# Altium footprint library MyPcbLib.PcbLib: 657 footprints (part 27 of 42)
Each footprint in its own frame and in the unit in brackets; x right, y up, seen from the top. Pads: shape width x height; smd on the part's side, far side on the other; paste and mask are expansions set on the pad; w line width, h text height; cw(c..) or ccw(c..) is an arc to the next point about the centre after c.
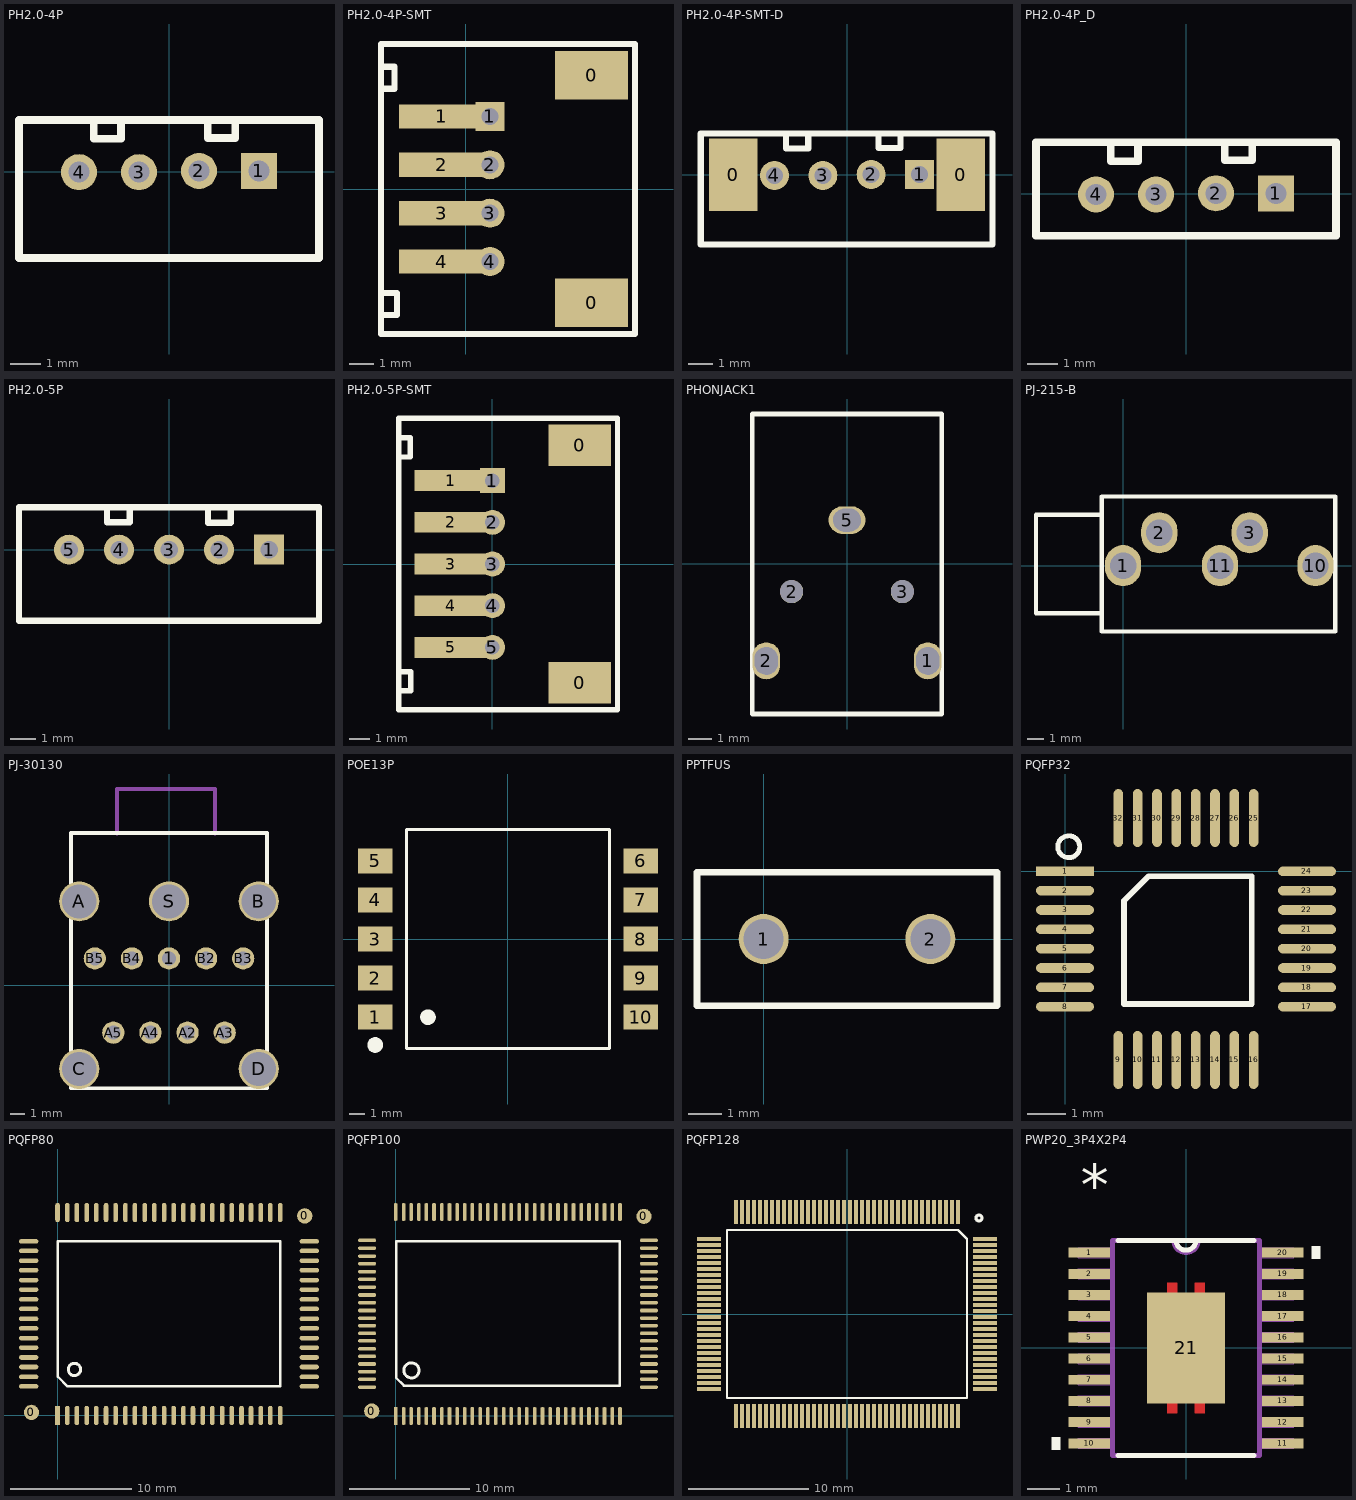
[diagram p26: the footprints below, top view; thin cyan lines are the x and y axes]

## PH2.0-4P [mm]
pads (4):
  rect 1.2x1.2 hole 0.7: 1(2.999,0.019)
  round 1.2 hole 0.7: 2(0.999,0.019) 3(-0.999,-0.019) 4(-2.999,-0.019)
Top Overlay:
  lines w0.254: -2.515,1.651 -2.515,1.092 -1.6,1.092 -1.6,1.6 ; 1.295,1.676 1.295,1.118 2.21,1.118 2.21,1.626 ; -5,-2.881 -5,1.719 4.999,1.719 4.999,-2.881 -5,-2.881

## PH2.0-4P-SMT [mm]
pads (10):
  rect 3x2 smd: 0(5.2,-4.7) 0(5.2,4.7)
  rect 3.5x1 smd: 1(-1,3) 2(-1,1) 3(-1,-1) 4(-1,-3)
  rect 1.2x1.2 hole 0.7: 1(1,3)
  round 1.2 hole 0.7: 2(1,1) 3(1,-1) 4(1,-3)
Top Overlay:
  lines w0.254: -3.505,4.141 -2.946,4.141 -2.946,5.055 -3.454,5.055 ; -3.403,-5.206 -2.845,-5.206 -2.845,-4.292 -3.353,-4.292 ; -3.5,-6 7,-6 7,6 -3.5,6 -3.5,-6

## PH2.0-4P-SMT-D [mm] "立贴"
pads (6):
  rect 2x3 smd: 0(-4.7,0) 0(4.7,0)
  rect 1.2x1.2 hole 0.7: 1(2.999,0.019)
  round 1.2 hole 0.7: 2(0.999,0.019) 3(-0.999,-0.019) 4(-2.999,-0.019)
Top Overlay:
  lines w0.254: -2.515,1.651 -2.515,1.092 -1.6,1.092 -1.6,1.6 ; 1.295,1.676 1.295,1.118 2.21,1.118 2.21,1.626 ; -6.045,-2.881 6.02,-2.881 6.02,1.719 -6.045,1.719 -6.045,-2.881

## PH2.0-4P_D [mm]
pads (4):
  rect 1.2x1.2 hole 0.7: 1(2.999,0.019)
  round 1.2 hole 0.7: 2(0.999,0.019) 3(-0.999,-0.019) 4(-2.999,-0.019)
Top Overlay:
  lines w0.254: -2.515,1.651 -2.515,1.092 -1.6,1.092 -1.6,1.6 ; 1.295,1.676 1.295,1.118 2.21,1.118 2.21,1.626 ; -5,-1.397 4.999,-1.397 4.999,1.719 -5,1.719 -5,-1.397

## PH2.0-5P [mm]
pads (5):
  rect 1.2x1.2 hole 0.7: 1(4,0)
  round 1.2 hole 0.7: 2(2,0) 3(0,0) 4(-2,0) 5(-4,0)
Top Overlay:
  lines w0.254: -2.479,1.657 -2.479,1.099 -1.565,1.099 -1.565,1.607 ; 1.56,1.632 1.56,1.073 2.474,1.073 2.474,1.581 ; -6,-2.845 -6,1.7 6,1.7 6,-2.845 -6,-2.845

## PH2.0-5P-SMT [mm]
pads (12):
  rect 3x2 smd: 0(4.2,-5.7) 0(4.2,5.7)
  rect 3.5x1 smd: 1(-2,4) 2(-2,2) 3(-2,0) 4(-2,-2) 5(-2,-4)
  rect 1.2x1.2 hole 0.7: 1(0,4)
  round 1.2 hole 0.7: 2(0,2) 3(0,0) 4(0,-2) 5(0,-4)
Top Overlay:
  lines w0.254: -4.505,5.141 -3.946,5.141 -3.946,6.055 -4.454,6.055 ; -4.48,-6.086 -3.921,-6.086 -3.921,-5.171 -4.429,-5.171 ; -4.5,-7 -4.5,7 6,7 6,-7 -4.5,-7

## PHONJACK1 [mm]
pads (5):
  oval 1.2x1.6 hole 1 slot 1.2 at 92 deg: 1(3.5,-4.2) 2(-3.5,-4.2)
  round 1 hole 1: 2(-2.4,-1.2) 3(2.4,-1.2)
  oval 1.6x1.2 hole 1 slot 1.2 at 1 deg: 5(0,1.9)
Top Overlay:
  lines w0.203: -4.1,-6.502 4.1,-6.502 4.1,6.498 -4.1,6.498 -4.1,-6.502

## PJ-215-B [mm]
pads (5):
  oval 2.2x2.5 hole 1.6: 1(0.003,-0.004) 2(2.203,1.996) 3(7.703,1.996) 10(11.703,-0.004) 11(5.903,-0.004)
Top Overlay:
  lines w0.254: -1.297,-2.904 -5.297,-2.904 -5.297,3.096 -1.297,3.096 ; -1.297,-4.004 12.903,-4.004 12.903,4.196 -1.297,4.196 -1.297,-4.004

## PJ-30130 [mm]
pads (14):
  round 1.5 hole 0.95: 1(-0.013,1.812) A2(1.237,-3.188) A3(3.737,-3.188) A4(-1.263,-3.188) A5(-3.763,-3.188) B2(2.487,1.812) B3(4.987,1.812) B4(-2.513,1.812) B5(-5.013,1.812)
  round 2.7 hole 2.3: A(-6.063,5.662) B(6.037,5.662) C(-6.063,-5.638) D(6.037,-5.638) S(-0.013,5.662)
Top Overlay:
  lines w0.254: -6.613,-6.938 6.587,-6.938 6.587,10.262 -6.613,10.262 -6.613,-6.938
Mechanical 1:
  lines w0.254: -3.523,10.234 -3.523,13.234 3.081,13.234 3.081,10.234

## POE13P [mm]
pads (10):
  rect 2.2x1.6 smd: 1(-8.5,-5) 2(-8.5,-2.5) 3(-8.5,0) 4(-8.5,2.5) 5(-8.5,5) 6(8.5,5) 7(8.5,2.5) 8(8.5,0) 9(8.5,-2.5) 10(8.5,-5)
Top Overlay:
  circle w0.6: c-5.122,-5 r0.2
  circle w0.6: c-8.5,-6.782 r0.2
  lines w0.203: -6.5,-7 -6.5,7 6.5,7 6.5,-7 -6.5,-7

## PPTFUS [mm]
pads (2):
  round 1.5 hole 1.2: 1(0,0) 2(5,0)
Top Overlay:
  lines w0.203: -2,-2 7,-2 7,2 -2,2 -2,-2

## PQFP32 [mm]
pads (32):
  rect 1.5x0.25 smd: 1(0,0)
  oval 1.5x0.25 smd: 2(0,-0.5) 3(0,-1) 4(0,-1.5) 5(0,-2) 6(0,-2.5) 7(0,-3) 8(0,-3.5) 17(6.254,-3.5) 18(6.254,-3) 19(6.254,-2.5) 20(6.254,-2) 21(6.254,-1.5) 22(6.254,-1) 23(6.254,-0.5) 24(6.254,0)
  oval 0.25x1.5 smd: 9(1.377,-4.877) 10(1.877,-4.877) 11(2.377,-4.877) 12(2.877,-4.877) 13(3.377,-4.877) 14(3.877,-4.877) 15(4.377,-4.877) 16(4.877,-4.877) 25(4.877,1.377) 26(4.377,1.377) 27(3.877,1.377) 28(3.377,1.377) 29(2.877,1.377) 30(2.377,1.377) 31(1.877,1.377) 32(1.377,1.377)
Top Overlay:
  circle w0.127: c0.097,0.635 r0.284
  lines w0.152: 1.524,-3.429 1.524,-0.762 2.159,-0.127 4.826,-0.127 4.826,-3.429 1.524,-3.429

## PQFP80 [mil]
pads (82):
  round 50 smd: 0(-85,10) 0(805,650)
  rect 15x63 smd: 1(0,0)
  oval 15x63 smd: 2(32,0) 3(63,0) 4(95,0) 5(126,0) 6(158,0) 7(189,0) 8(221,0) 9(252,0) 10(284,0) 11(315,0) 12(347,0) 13(378,0) 14(410,0) 15(441,0) 16(473,0) 17(504,0) 18(536,0) 19(567,0) 20(599,0) 21(630,0) 22(662,0) 23(693,0) 24(725,0) 41(725,661) 42(693,661) 43(662,661) 44(630,661) 45(599,661) 46(567,661) 47(536,661) 48(504,661) 49(473,661) 50(441,661) 51(410,661) 52(378,661) 53(347,661) 54(315,661) 55(284,661) 56(252,661) 57(221,661) 58(189,661) 59(158,661) 60(126,661) 61(95,661) 62(63,661) 63(32,661) 64(0,661)
  oval 63x15 smd: 25(820,95) 26(820,126) 27(820,158) 28(820,189) 29(820,221) 30(820,252) 31(820,284) 32(820,315) 33(820,347) 34(820,378) 35(820,410) 36(820,441) 37(820,473) 38(820,504) 39(820,536) 40(820,567) 65(-94,567) 66(-94,536) 67(-94,504) 68(-94,473) 69(-94,441) 70(-94,410) 71(-94,378) 72(-94,347) 73(-94,315) 74(-94,284) 75(-94,252) 76(-94,221) 77(-94,189) 78(-94,158) 79(-94,126) 80(-94,95)
Top Overlay:
  circle w10: c55,150 r20
  lines w8: 0,126 0,567 725,567 725,95 32,95 1,126

## PQFP100 [mil]
pads (102):
  round 50 smd: 0(-78.74,16.26) 0(816.74,656.74)
  rect 12x60 smd: 1(0,0)
  oct 12x60 smd: 2(26,0) 3(51,0) 4(76,0) 5(101,0) 6(126,0) 7(152,0) 8(177,0) 9(202,0) 10(227,0) 11(252,0) 12(278,0) 13(303,0) 14(329,0) 15(355,0) 16(380,0) 17(406,0) 18(431,0) 19(457,0) 20(483,0) 21(508,0) 22(534,0) 23(559,0) 24(585,0) 25(611,0) 26(636,0) 27(662,0) 28(687,0) 29(713,0) 30(738,0) 51(738,671) 52(713,671) 53(687,671) 54(662,671) 55(636,671) 56(611,671) 57(585,671) 58(559,671) 59(534,671) 60(508,671) 61(483,671) 62(457,671) 63(431,671) 64(406,671) 65(380,671) 66(355,671) 67(329,671) 68(303,671) 69(278,671) 70(252,671) 71(227,671) 72(202,671) 73(177,671) 74(152,671) 75(126,671) 76(101,671) 77(76,671) 78(51,671) 79(26,671) 80(0,671)
  oct 60x12 smd: 31(833,95) 32(833,121) 33(833,146) 34(833,171) 35(833,196) 36(833,221) 37(833,247) 38(833,272) 39(833,297) 40(833,322) 41(833,347) 42(833,373) 43(833,398) 44(833,424) 45(833,450) 46(833,475) 47(833,501) 48(833,526) 49(833,552) 50(833,578) 81(-94,578) 82(-94,552) 83(-94,526) 84(-94,501) 85(-94,475) 86(-94,450) 87(-94,424) 88(-94,398) 89(-94,373) 90(-94,347) 91(-94,322) 92(-94,297) 93(-94,272) 94(-94,247) 95(-94,221) 96(-94,196) 97(-94,171) 98(-94,146) 99(-94,121) 100(-94,95)
Top Overlay:
  circle w10: c52,150 r25
  lines w8: 2,125 27,100 737,100 737,575 2,575 2,125

## PQFP128 [mm]
pads (128):
  rect 0.3x2 smd: 1(9.25,8.5) 2(8.75,8.5) 3(8.25,8.5) 4(7.75,8.5) 5(7.25,8.5) 6(6.75,8.5) 7(6.25,8.5) 8(5.75,8.5) 9(5.25,8.5) 10(4.75,8.5) 11(4.25,8.5) 12(3.75,8.5) 13(3.25,8.5) 14(2.75,8.5) 15(2.25,8.5) 16(1.75,8.5) 17(1.25,8.5) 18(0.75,8.5) 19(0.25,8.5) 20(-0.25,8.5) 21(-0.75,8.5) 22(-1.25,8.5) 23(-1.75,8.5) 24(-2.25,8.5) 25(-2.75,8.5) 26(-3.25,8.5) 27(-3.75,8.5) 28(-4.25,8.5) 29(-4.75,8.5) 30(-5.25,8.5) 31(-5.75,8.5) 32(-6.25,8.5) 33(-6.75,8.5) 34(-7.25,8.5) 35(-7.75,8.5) 36(-8.25,8.5) 37(-8.75,8.5) 38(-9.25,8.5) 65(-9.25,-8.5) 66(-8.75,-8.5) 67(-8.25,-8.5) 68(-7.75,-8.5) 69(-7.25,-8.5) 70(-6.75,-8.5) 71(-6.25,-8.5) 72(-5.75,-8.5) 73(-5.25,-8.5) 74(-4.75,-8.5) 75(-4.25,-8.5) 76(-3.75,-8.5) 77(-3.25,-8.5) 78(-2.75,-8.5) 79(-2.25,-8.5) 80(-1.75,-8.5) 81(-1.25,-8.5) 82(-0.75,-8.5) 83(-0.25,-8.5) 84(0.25,-8.5) 85(0.75,-8.5) 86(1.25,-8.5) 87(1.75,-8.5) 88(2.25,-8.5) 89(2.75,-8.5) 90(3.25,-8.5) 91(3.75,-8.5) 92(4.25,-8.5) 93(4.75,-8.5) 94(5.25,-8.5) 95(5.75,-8.5) 96(6.25,-8.5) 97(6.75,-8.5) 98(7.25,-8.5) 99(7.75,-8.5) 100(8.25,-8.5) 101(8.75,-8.5) 102(9.25,-8.5)
  rect 2x0.3 smd: 39(-11.5,6.25) 40(-11.5,5.75) 41(-11.5,5.25) 42(-11.5,4.75) 43(-11.5,4.25) 44(-11.5,3.75) 45(-11.5,3.25) 46(-11.5,2.75) 47(-11.5,2.25) 48(-11.5,1.75) 49(-11.5,1.25) 50(-11.5,0.75) 51(-11.5,0.25) 52(-11.5,-0.25) 53(-11.5,-0.75) 54(-11.5,-1.25) 55(-11.5,-1.75) 56(-11.5,-2.25) 57(-11.5,-2.75) 58(-11.5,-3.25) 59(-11.5,-3.75) 60(-11.5,-4.25) 61(-11.5,-4.75) 62(-11.5,-5.25) 63(-11.5,-5.75) 64(-11.5,-6.25) 103(11.5,-6.25) 104(11.5,-5.75) 105(11.5,-5.25) 106(11.5,-4.75) 107(11.5,-4.25) 108(11.5,-3.75) 109(11.5,-3.25) 110(11.5,-2.75) 111(11.5,-2.25) 112(11.5,-1.75) 113(11.5,-1.25) 114(11.5,-0.75) 115(11.5,-0.25) 116(11.5,0.25) 117(11.5,0.75) 118(11.5,1.25) 119(11.5,1.75) 120(11.5,2.25) 121(11.5,2.75) 122(11.5,3.25) 123(11.5,3.75) 124(11.5,4.25) 125(11.5,4.75) 126(11.5,5.25) 127(11.5,5.75) 128(11.5,6.25)
Top Overlay:
  circle w0.254: c11,8 r0.25
  lines w0.203: -10,-7 -10,7 9.25,7 10,6.25 10,-7 -10,-7

## PWP20_3P4X2P4 [mil]
height 100
pads (21):
  rect 50x12 smd: 1(-117,115.16) 2(-117,89.57) 3(-117,63.98) 4(-117,38.39) 5(-117,12.8) 6(-117,-12.8) 7(-117,-38.39) 8(-117,-63.98) 9(-117,-89.57) 10(-117,-115.16) 11(117,-115.16) 12(117,-89.57) 13(117,-63.98) 14(117,-38.39) 15(117,-12.8) 16(117,12.8) 17(117,38.39) 18(117,63.98) 19(117,89.57) 20(117,115.16)
  rect 94.49x133.86 smd: 21(0,0)
Top Layer:
  region: 22.64,-66.93 10.83,-66.93 10.83,-78.74 22.64,-78.74
  region: -22.64,-66.93 -10.83,-66.93 -10.83,-78.74 -22.64,-78.74
  region: -22.64,66.93 -10.83,66.93 -10.83,78.74 -22.64,78.74
  region: 22.64,66.93 10.83,66.93 10.83,78.74 22.64,78.74
  region: 0,-66.93
  region: 0,66.93
Top Overlay:
  region: 152,122.66 162,122.66 162,107.66 152,107.66
  region: -152,-107.66 -162,-107.66 -162,-122.66 -152,-122.66
  lines w6: -82.33,-130 82.33,-130 ; -82.33,130 82.33,130 ; -12,130 ccw(c0,130) 12,130
  text "*" at -127,172.16 h50
Top Solder:
  region: 22.64,-66.93 10.83,-66.93 10.83,-78.74 22.64,-78.74
  region: -22.64,-66.93 -10.83,-66.93 -10.83,-78.74 -22.64,-78.74
  region: -22.64,66.93 -10.83,66.93 -10.83,78.74 -22.64,78.74
  region: 22.64,66.93 10.83,66.93 10.83,78.74 22.64,78.74
  region: 0,-66.93
  region: 0,66.93
Mechanical 1:
  lines w0: -12,130 ccw(c0,130) 12,130 ; -130,-121.16 -88.5,-121.16 -88.5,-109.16 -130,-109.16 -130,-121.16 ; -130,-95.57 -88.5,-95.57 -88.5,-83.57 -130,-83.57 -130,-95.57 ; -130,-69.98 -88.5,-69.98 -88.5,-57.98 -130,-57.98 -130,-69.98 ; -130,-44.39 -88.5,-44.39 -88.5,-32.39 -130,-32.39 -130,-44.39 ; -130,-18.8 -88.5,-18.8 -88.5,-6.8 -130,-6.8 -130,-18.8 ; -130,6.8 -88.5,6.8 -88.5,18.8 -130,18.8 -130,6.8 ; -130,32.39 -88.5,32.39 -88.5,44.39 -130,44.39 -130,32.39 ; -130,57.98 -88.5,57.98 -88.5,69.98 -130,69.98 -130,57.98 ; -130,83.57 -88.5,83.57 -88.5,95.57 -130,95.57 -130,83.57 ; -130,109.16 -88.5,109.16 -88.5,121.16 -130,121.16 -130,109.16 ; -88.5,-130 -88.5,130 88.5,130 88.5,-130 -88.5,-130 ; 88.5,-121.16 130,-121.16 130,-109.16 88.5,-109.16 88.5,-121.16 ; 88.5,-95.57 130,-95.57 130,-83.57 88.5,-83.57 88.5,-95.57 ; 88.5,-69.98 130,-69.98 130,-57.98 88.5,-57.98 88.5,-69.98 ; 88.5,-44.39 130,-44.39 130,-32.39 88.5,-32.39 88.5,-44.39 ; 88.5,-18.8 130,-18.8 130,-6.8 88.5,-6.8 88.5,-18.8 ; 88.5,6.8 130,6.8 130,18.8 88.5,18.8 88.5,6.8 ; 88.5,32.39 130,32.39 130,44.39 88.5,44.39 88.5,32.39 ; 88.5,57.98 130,57.98 130,69.98 88.5,69.98 88.5,57.98 ; 88.5,83.57 130,83.57 130,95.57 88.5,95.57 88.5,83.57 ; 88.5,109.16 130,109.16 130,121.16 88.5,121.16 88.5,109.16
  lines w6: -14.75,130 ccw(c0,130) 14.75,130 ; -88.5,-130 88.5,-130 88.5,130 -88.5,130 -88.5,-130
  text "100" at 0,0 h50
  text "*" at -127,172.16 h50